# Altium footprint library c3_PcbLib.PcbLib: 222 footprints (part 6 of 14)
Each footprint in its own frame and in the unit in brackets; x right, y up, seen from the top. Pads: shape width x height; smd on the part's side, far side on the other; paste and mask are expansions set on the pad; w line width, h text height; cw(c..) or ccw(c..) is an arc to the next point about the centre after c.
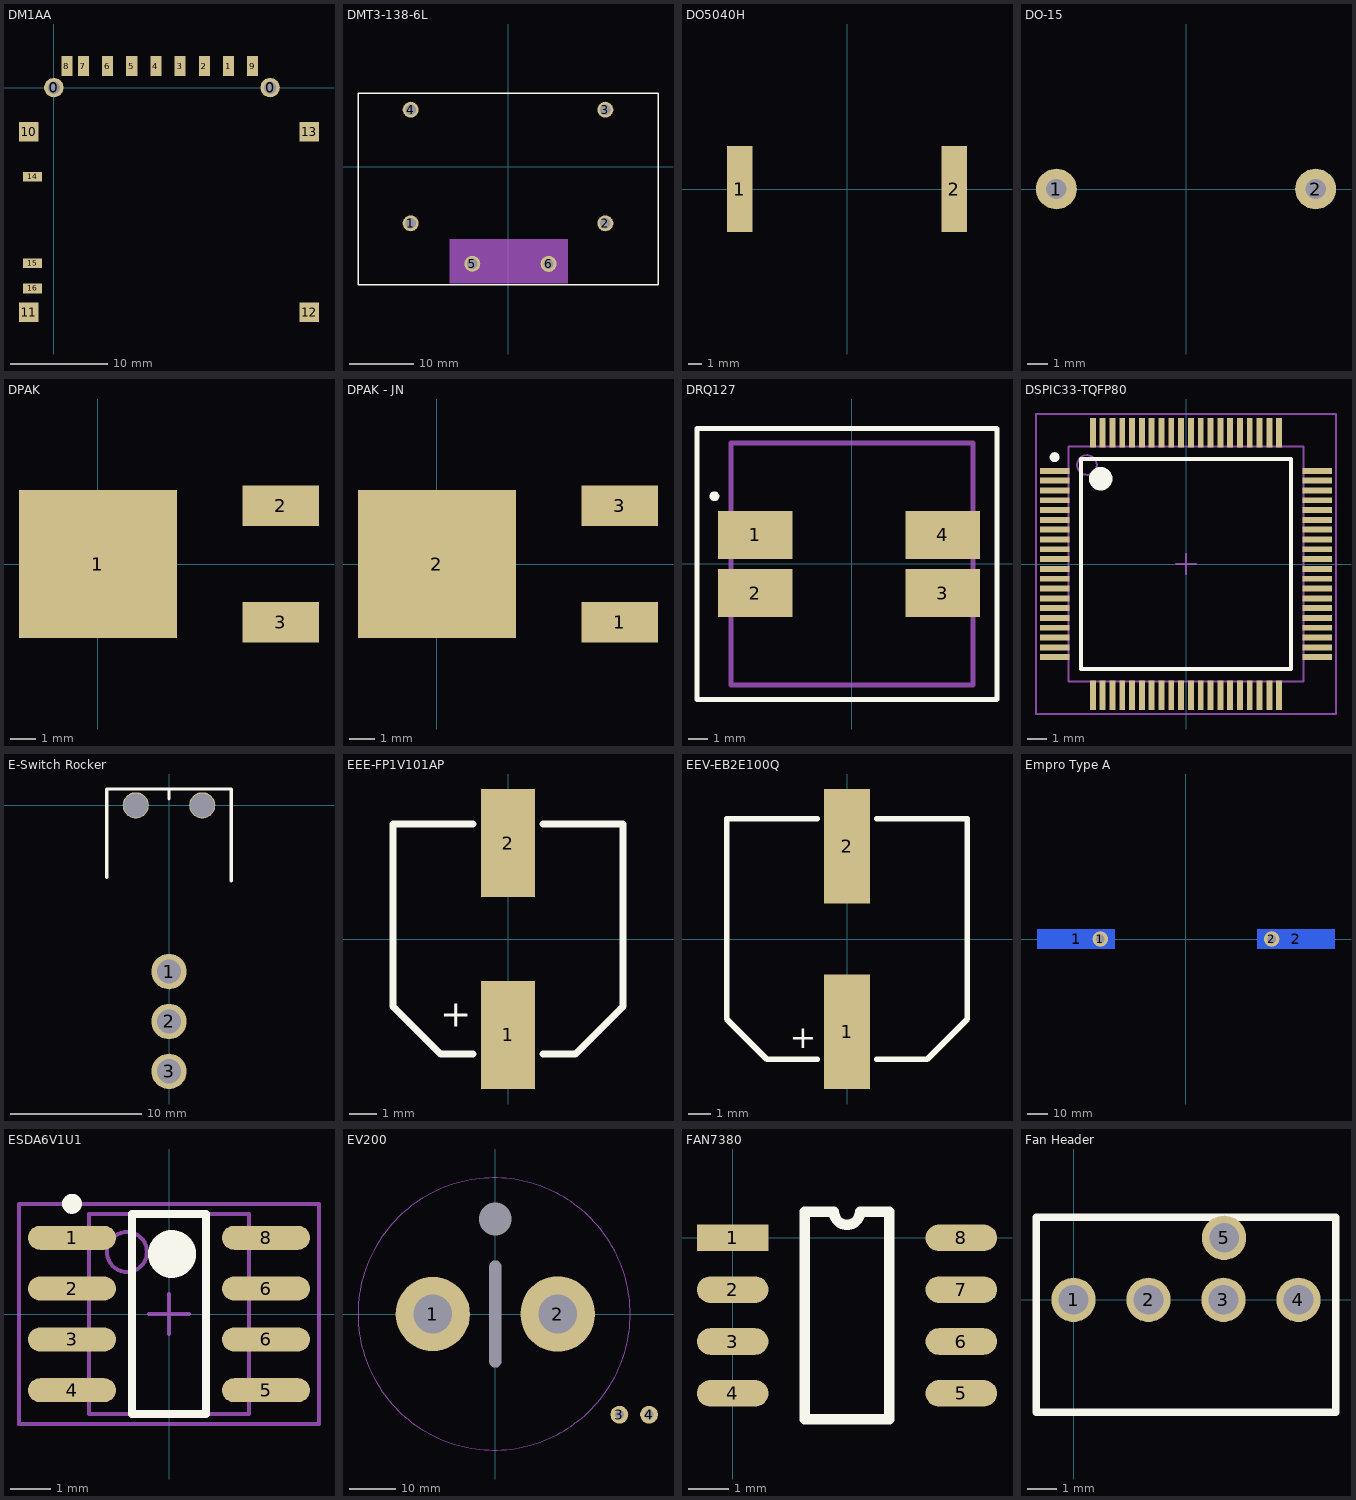
[diagram p5: the footprints below, top view; thin cyan lines are the x and y axes]

## DM1AA [mm]
pads (18):
  round 2 hole 1.3: 0(0,0) 0(22.352,0)
  rect 1.14x2.05 smd mask+0.102: 1(18.05,2.225) 2(15.55,2.225) 3(13.05,2.225) 4(10.55,2.225) 5(8.05,2.225) 6(5.55,2.225) 7(3.05,2.225) 8(1.35,2.225) 9(20.55,2.225)
  rect 2x2 smd mask+0.102: 10(-2.6,-4.55) 11(-2.6,-23.2) 12(26.4,-23.2) 13(26.4,-4.55)
  rect 2x1 smd mask+0.102: 14(-2.2,-9.2) 15(-2.2,-18.15) 16(-2.2,-20.75)
3D body: height 2.9, standoff -0.55, extent -3.186,-27.94 26.814,2.56

## DMT3-138-6L [mm] "Inductor"
pads (6):
  round 2.5 hole 1.6: 1(-15.25,-8.9) 2(15.25,-8.9) 3(15.25,8.9) 4(-15.25,8.9) 5(-5.588,-15.24) 6(6.36,-15.25)
Top Overlay:
  lines w0.2: -23.5,-18.542 -23.5,11.5 23.5,11.5 23.5,-18.542 4.708,-18.542 -4.708,-18.542 -23.5,-18.542
Mechanical 1:
  region: -9.144,-11.43 9.398,-11.43 9.398,-18.288 -9.144,-18.288
3D body: height 48.28, standoff -5.6, extent -23.5,-11.43 23.5,11.43

## DO5040H [mm]
pads (2):
  rect 1.9x6.35 smd: 1(-7.95,0) 2(7.95,0)
3D body: height 12.04, standoff 0.04, extent -9.27,-7.493 9.27,7.239

## DO-15 [mm]
pads (2):
  round 2 hole 1: 1(-6.35,0) 2(6.35,0)
3D body: height 4.78, standoff -2, extent -6.78,-1.831 6.78,1.729

## DPAK [mm]
pads (3):
  rect 6.2x5.8 smd: 1(0,0)
  rect 3x1.6 smd: 2(7.18,2.285) 3(7.18,-2.285)
3D body: height 2.3, standoff 0, extent -2.693,-3.325 6.807,3.175

## DPAK - JN [mm]
pads (3):
  rect 3x1.6 smd: 1(7.18,-2.285) 3(7.18,2.285)
  rect 6.2x5.8 smd: 2(0,0)
3D body: height 2.3, standoff 0, extent -2.693,-3.325 6.807,3.175

## DRQ127 [mm]
pads (4):
  rect 3.85x2.5 smd: 1(-5,1.5) 2(-5,-1.5) 3(4.7,-1.5) 4(4.7,1.5)
Top Overlay:
  circle w0.254: c-7.1,3.5 r0.125
  lines w0.254: -8,-7 7.5,-7 7.5,7 -8,7 -8,-7
Mechanical 1:
  lines w0.254: -6.25,-6.25 6.25,-6.25 6.25,6.25 -6.25,6.25 -6.25,-6.25
3D body: height 8, standoff 0, extent -6.25,-6.25 6.25,6.25

## DSPIC33-TQFP80 [mm] "TSQFP, 80-Leads, Body 14.0x14.0mm (max), Pitch 0.50mm, IPC Medium Density"
height 1.2
pads (80):
  rect 1.5x0.3 smd: 1(-6.7,4.75) 2(-6.7,4.25) 3(-6.7,3.75) 4(-6.7,3.25) 5(-6.7,2.75) 6(-6.7,2.25) 7(-6.7,1.75) 8(-6.7,1.25) 9(-6.7,0.75) 10(-6.7,0.25) 11(-6.7,-0.25) 12(-6.7,-0.75) 13(-6.7,-1.25) 14(-6.7,-1.75) 15(-6.7,-2.25) 16(-6.7,-2.75) 17(-6.7,-3.25) 18(-6.7,-3.75) 19(-6.7,-4.25) 20(-6.7,-4.75) 41(6.7,-4.75) 42(6.7,-4.25) 43(6.7,-3.75) 44(6.7,-3.25) 45(6.7,-2.75) 46(6.7,-2.25) 47(6.7,-1.75) 48(6.7,-1.25) 49(6.7,-0.75) 50(6.7,-0.25) 51(6.7,0.25) 52(6.7,0.75) 53(6.7,1.25) 54(6.7,1.75) 55(6.7,2.25) 56(6.7,2.75) 57(6.7,3.25) 58(6.7,3.75) 59(6.7,4.25) 60(6.7,4.75)
  rect 0.3x1.5 smd: 21(-4.75,-6.7) 22(-4.25,-6.7) 23(-3.75,-6.7) 24(-3.25,-6.7) 25(-2.75,-6.7) 26(-2.25,-6.7) 27(-1.75,-6.7) 28(-1.25,-6.7) 29(-0.75,-6.7) 30(-0.25,-6.7) 31(0.25,-6.7) 32(0.75,-6.7) 33(1.25,-6.7) 34(1.75,-6.7) 35(2.25,-6.7) 36(2.75,-6.7) 37(3.25,-6.7) 38(3.75,-6.7) 39(4.25,-6.7) 40(4.75,-6.7) 61(4.75,6.7) 62(4.25,6.7) 63(3.75,6.7) 64(3.25,6.7) 65(2.75,6.7) 66(2.25,6.7) 67(1.75,6.7) 68(1.25,6.7) 69(0.75,6.7) 70(0.25,6.7) 71(-0.25,6.7) 72(-0.75,6.7) 73(-1.25,6.7) 74(-1.75,6.7) 75(-2.25,6.7) 76(-2.75,6.7) 77(-3.25,6.7) 78(-3.75,6.7) 79(-4.25,6.7) 80(-4.75,6.7)
Top Overlay:
  circle w0.25: c-6.7,5.45 r0.125
  circle w0.6: c-4.35,4.35 r0.3
  lines w0.2: -5.35,-5.35 -5.35,5.35 5.35,5.35 5.35,-5.35 -5.35,-5.35
Mechanical 13:
  circle w0.1: c-5.05,5.05 r0.5
  lines w0.1: -6,-6 -6,6 6,6 6,-6 -6,-6
Mechanical 15:
  lines w0.1: -0.5,0 0.5,0 ; 0,-0.5 0,0.5 ; -7.65,-7.65 -7.65,7.65 7.65,7.65 7.65,-7.65 -7.65,-7.65
3D body: height 1.2, standoff 0.05, extent -6,-6 6,6

## E-Switch Rocker [mm] "For part 300SP1J1BLKM7QE"
pads (5):
  round 2.7 hole 1.85: 1(0,-12.7) 2(0,-16.51) 3(0,-20.32)
  round 2 hole 1.85: ""(-2.54,0) ""(2.54,0)
Top Overlay:
  lines w0.254: -4.75,-5.5 -4.75,-0.5 ; -4.75,-0.75 -4.75,1.25 ; -4.63,1.25 4.63,1.25 ; 0,0.5 0,1.25 ; 4.75,-5.75 4.75,-0.75 4.75,1.25
3D body: height 12.7, standoff 0, extent -4.699,-21.971 4.572,1.143

## EEE-FP1V101AP [mm]
pads (2):
  rect 2x4 smd: 1(0,-3.55) 2(0,3.55)
Top Overlay:
  lines w0.254: -1.3,-4.25 -2.5,-4.25 -4.25,-2.5 -4.25,4.25 -1.3,4.25 ; 1.3,-4.25 2.5,-4.25 4.25,-2.5 4.25,4.25 1.3,4.25
  text "+" at -2.5,-3.25 h1.02

## EEV-EB2E100Q [mm]
pads (2):
  rect 2x5 smd: 1(0,-4.05) 2(0,4.05)
Top Overlay:
  lines w0.254: -1.3,-5.25 -3.5,-5.25 -5.25,-3.5 -5.25,5.25 -1.3,5.25 ; 1.3,-5.25 3.5,-5.25 5.25,-3.5 5.25,5.25 1.3,5.25
  text "+" at -2.502,-4.763 h1.02

## Empro Type A [mil]
pads (4):
  rect 1500x375 smd far side: 1(-2125,0) 2(2125,0)
  round 300 hole 165: 1(-1656.25,0) 2(1656.25,0)
Bottom Overlay:
  lines w20: -2900,-211 2901.5,-211 2901.5,210.5 -2900,210.5 -2900,-211
3D body: height 625, standoff 0, extent -2875,-188 2875.5,187

## ESDA6V1U1 [mm] "SOP, 8-Leads, Body 5.0x4.0mm (max), Pitch 1.27mm, IPC Medium Density"
height 1.75
pads (8):
  oval 2.2x0.6 smd: 1(-2.425,1.905) 2(-2.425,0.635) 3(-2.425,-0.635) 4(-2.425,-1.905) 5(2.425,-1.905) 6(2.425,-0.635) 6(2.425,0.635) 8(2.425,1.905)
Top Overlay:
  circle w0.25: c-2.425,2.755 r0.125
  circle w0.6: c0.075,1.5 r0.3
  lines w0.2: -0.925,-2.5 -0.925,2.5 0.925,2.5 0.925,-2.5 -0.925,-2.5
Mechanical 13:
  circle w0.1: c-1.05,1.55 r0.5
  lines w0.1: -2,-2.5 -2,2.5 2,2.5 2,-2.5 -2,-2.5
Mechanical 15:
  lines w0.1: -0.5,0 0.5,0 ; 0,-0.5 0,0.5 ; -3.75,-2.75 -3.75,2.75 3.75,2.75 3.75,-2.75 -3.75,-2.75
3D body: height 1.75, standoff 0.19, extent -2,-2.5 2,2.5

## EV200 [mil]
pads (6):
  rrect50% 0x0 hole 100 slot 900 at 90 deg: 0(0,0)
  round 0 hole 275: 0(0,800)
  round 625 hole 325: 1(-525,0)
  oval 625x635 hole 325: 2(525,0)
  round 150 hole 75: 3(1044,-847) 4(1294,-847)
Mechanical 1:
  circle w10: c-10,0 r1145
3D body: height 1100, standoff -2200, extent -1579.61,-1436.52 1582,1144.52

## FAN7380 [mm]
height 5
pads (8):
  rect 1.75x0.65 smd: 1(0,0)
  oval 1.75x0.65 smd: 2(0,-1.27) 3(0,-2.54) 4(0,-3.81) 5(5.6,-3.81) 6(5.6,-2.54) 7(5.6,-1.27) 8(5.6,0)
Top Overlay:
  lines w0.254: 1.764,-4.445 1.764,0.635 2.482,0.635 ccw(c2.8,0.635) 3.117,0.635 3.836,0.635 3.836,-4.445 1.764,-4.445

## Fan Header [mm] "4 Pin Fan Header"
height 10
pads (5):
  round 1.5 hole 1: 1(0,0) 2(2.54,0) 3(5.08,0) 4(7.62,0) 5(5.1,2.1)
Top Overlay:
  lines w0.254: -1.27,-3.81 -1.27,0 -1.27,2.794 8.89,2.794 8.89,-3.81 -1.27,-3.81
3D body: height 11.15, standoff -3.4, extent -1.185,-3.63 8.785,2.7